# Altium footprint library ICs And Semiconductors SMD.PcbLib: 602 footprints (part 24 of 38)
Each footprint in its own frame and in the unit in brackets; x right, y up, seen from the top. Pads: shape width x height; smd on the part's side, far side on the other; paste and mask are expansions set on the pad; w line width, h text height; cw(c..) or ccw(c..) is an arc to the next point about the centre after c.
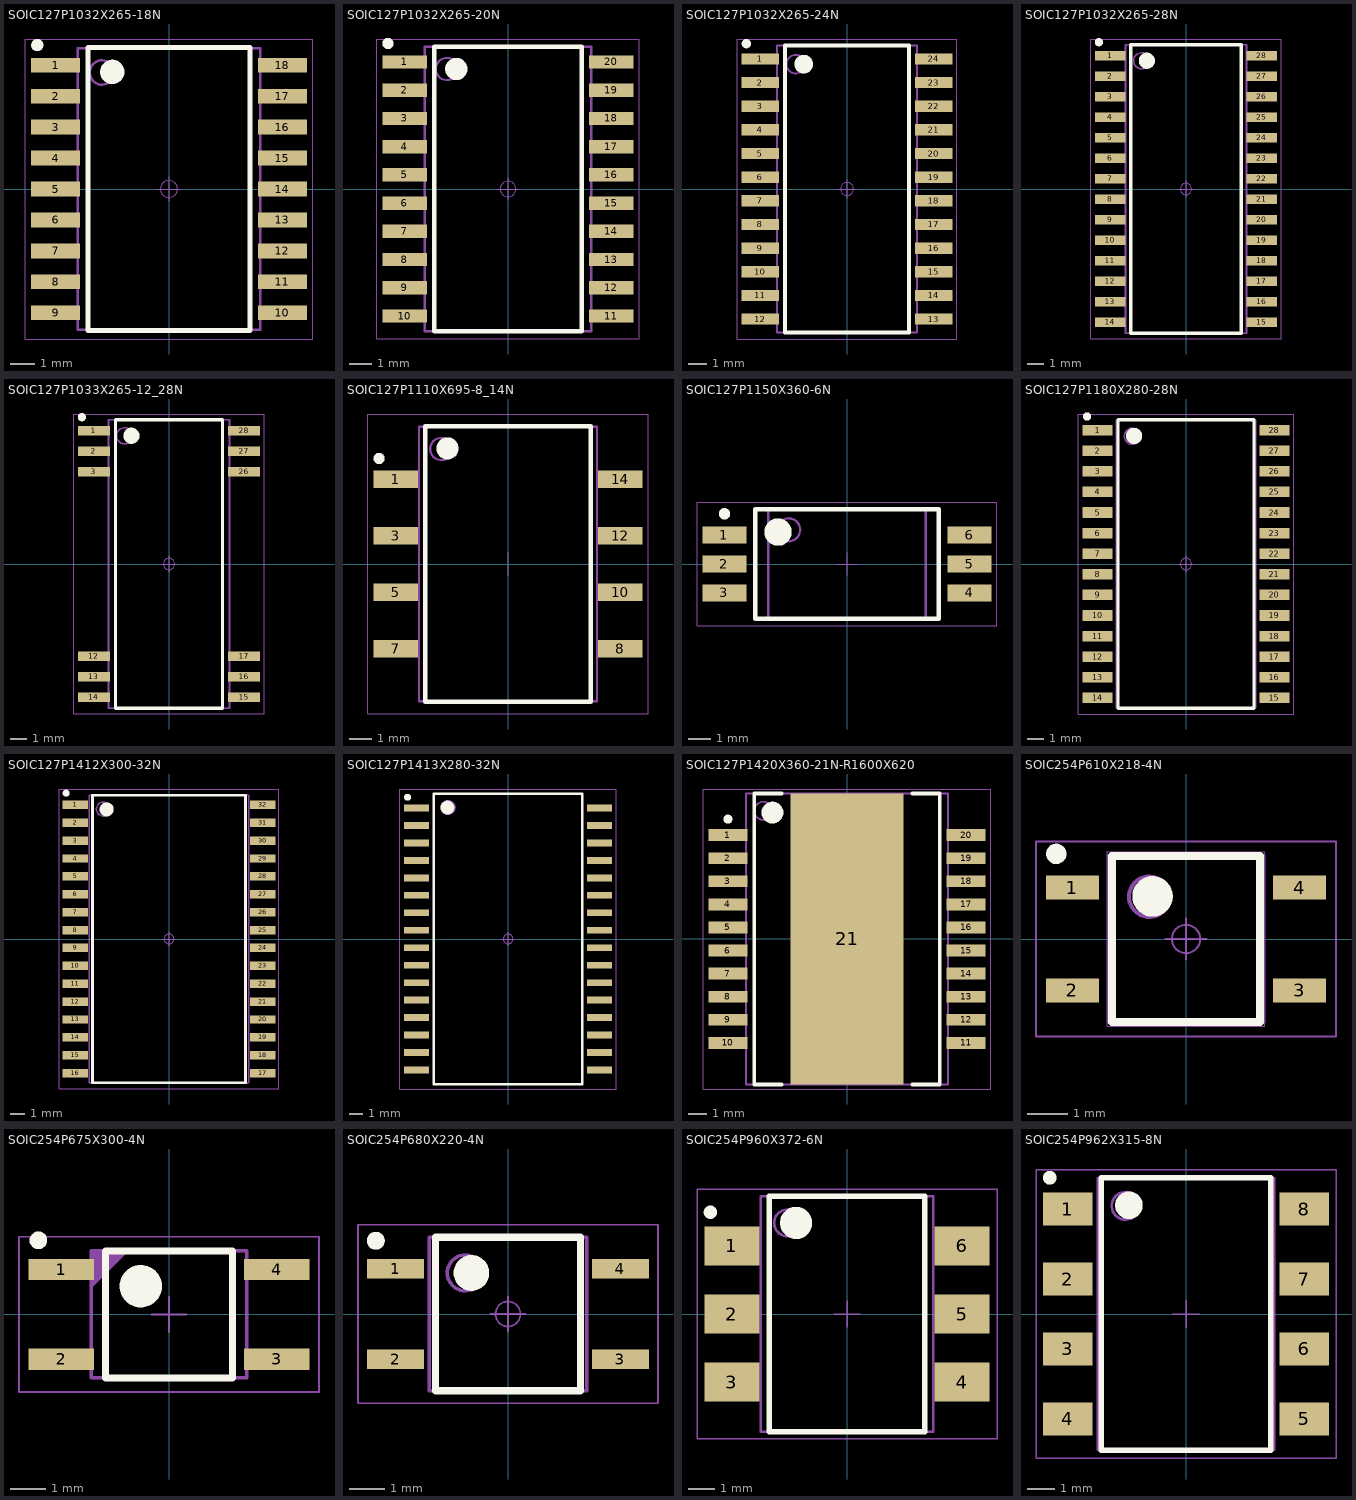
[diagram p23: the footprints below, top view; thin cyan lines are the x and y axes]

## SOIC127P1032X265-18N [mm] "SOIC, 1.27mm Pitch; 18 Pin, 7.50mm W X 11.55mm L X 2.65mm H Body, IPC Medium Density"
height 2.65
pads (18):
  rect 2x0.6 smd: 1(-4.65,5.08) 2(-4.65,3.81) 3(-4.65,2.54) 4(-4.65,1.27) 5(-4.65,0) 6(-4.65,-1.27) 7(-4.65,-2.54) 8(-4.65,-3.81) 9(-4.65,-5.08) 10(4.65,-5.08) 11(4.65,-3.81) 12(4.65,-2.54) 13(4.65,-1.27) 14(4.65,0) 15(4.65,1.27) 16(4.65,2.54) 17(4.65,3.81) 18(4.65,5.08)
Top Overlay:
  circle w0.25: c-5.4,5.9 r0.125
  circle w0.5: c-2.325,4.8 r0.25
  lines w0.2: -3.325,-5.8 -3.325,5.8 3.325,5.8 3.325,-5.8 -3.325,-5.8
Mechanical 14:
  circle w0.1: c-2.75,4.775 r0.5
  lines w0.1: -3.75,-5.775 -3.75,5.775 3.75,5.775 3.75,-5.775 -3.75,-5.775
Mechanical 15:
  circle w0.05: c0,0 r0.35
  lines w0.05: -0.5,0 0.5,0 ; 0,-0.5 0,0.5 ; -5.9,-6.15 -5.9,6.15 5.9,6.15 5.9,-6.15 -5.9,-6.15
3D body "SOIC127P1032X265-18N.stp": height 1.68, standoff 0, extent -5.18,-5.875 5.18,5.875

## SOIC127P1032X265-20N [mm] "SOIC, 1.27mm pitch; 20 pin, 7.50mm W X 12.80mm L X 2.65mm H body, IPC Medium Density"
height 2.65
pads (20):
  rect 2x0.6 smd: 1(-4.65,5.715) 2(-4.65,4.445) 3(-4.65,3.175) 4(-4.65,1.905) 5(-4.65,0.635) 6(-4.65,-0.635) 7(-4.65,-1.905) 8(-4.65,-3.175) 9(-4.65,-4.445) 10(-4.65,-5.715) 11(4.65,-5.715) 12(4.65,-4.445) 13(4.65,-3.175) 14(4.65,-1.905) 15(4.65,-0.635) 16(4.65,0.635) 17(4.65,1.905) 18(4.65,3.175) 19(4.65,4.445) 20(4.65,5.715)
Top Overlay:
  circle w0.5: c-2.325,5.4 r0.25
  circle w0.25: c-5.4,6.55 r0.125
  lines w0.2: -3.325,-6.4 3.325,-6.4 3.325,6.4 -3.325,6.4 -3.325,-6.4
Mechanical 14:
  circle w0.1: c-2.75,5.4 r0.5
  lines w0.1: -3.75,-6.4 3.75,-6.4 3.75,6.4 -3.75,6.4 -3.75,-6.4
Mechanical 15:
  circle w0.05: c0,0 r0.35
  lines w0.05: -0.5,0 0.5,0 ; 0,-0.5 0,0.5 ; -5.9,-6.75 5.9,-6.75 5.9,6.75 -5.9,6.75 -5.9,-6.75
3D body "SOIC127P1032X265-20N.stp": height 1.68, standoff 0, extent -5.18,-6.5 5.18,6.5

## SOIC127P1032X265-24N [mm] "SOIC, 1.27mm Pitch; 24 Pin,7.50mm W X 15.40mm L X 2.65mm H Body, IPC Medium Density"
height 2.65
pads (24):
  rect 2x0.6 smd: 1(-4.65,6.985) 2(-4.65,5.715) 3(-4.65,4.445) 4(-4.65,3.175) 5(-4.65,1.905) 6(-4.65,0.635) 7(-4.65,-0.635) 8(-4.65,-1.905) 9(-4.65,-3.175) 10(-4.65,-4.445) 11(-4.65,-5.715) 12(-4.65,-6.985) 13(4.65,-6.985) 14(4.65,-5.715) 15(4.65,-4.445) 16(4.65,-3.175) 17(4.65,-1.905) 18(4.65,-0.635) 19(4.65,0.635) 20(4.65,1.905) 21(4.65,3.175) 22(4.65,4.445) 23(4.65,5.715) 24(4.65,6.985)
Top Overlay:
  circle w0.25: c-5.4,7.8 r0.125
  circle w0.5: c-2.325,6.7 r0.25
  lines w0.2: -3.325,-7.7 -3.325,7.7 3.325,7.7 3.325,-7.7 -3.325,-7.7
Mechanical 14:
  circle w0.1: c-2.75,6.7 r0.5
  lines w0.1: -3.75,-7.7 -3.75,7.7 3.75,7.7 3.75,-7.7 -3.75,-7.7
Mechanical 15:
  circle w0.05: c0,0 r0.35
  lines w0.05: -0.5,0 0.5,0 ; 0,-0.5 0,0.5 ; -5.9,-8.05 -5.9,8.05 5.9,8.05 5.9,-8.05 -5.9,-8.05
3D body "SOIC127P1032X265-24N.stp": height 1.68, standoff 0, extent -5.18,-7.8 5.18,7.8

## SOIC127P1032X265-28N [mm] "SOIC,1.27mm, Pitch;28 Pin, 7.50mm W X 17.90mm L X 2.65mm H body, IPC Medium Density"
height 2.65
pads (28):
  rect 1.9x0.6 smd: 1(-4.7,8.255) 2(-4.7,6.985) 3(-4.7,5.715) 4(-4.7,4.445) 5(-4.7,3.175) 6(-4.7,1.905) 7(-4.7,0.635) 8(-4.7,-0.635) 9(-4.7,-1.905) 10(-4.7,-3.175) 11(-4.7,-4.445) 12(-4.7,-5.715) 13(-4.7,-6.985) 14(-4.7,-8.255) 15(4.7,-8.255) 16(4.7,-6.985) 17(4.7,-5.715) 18(4.7,-4.445) 19(4.7,-3.175) 20(4.7,-1.905) 21(4.7,-0.635) 22(4.7,0.635) 23(4.7,1.905) 24(4.7,3.175) 25(4.7,4.445) 26(4.7,5.715) 27(4.7,6.985) 28(4.7,8.255)
Top Overlay:
  circle w0.5: c-2.425,7.95 r0.25
  circle w0.25: c-5.4,9.1 r0.125
  lines w0.2: -3.425,-8.95 3.425,-8.95 3.425,8.95 -3.425,8.95 -3.425,-8.95
Mechanical 14:
  circle w0.1: c-2.75,7.95 r0.5
  lines w0.1: -3.75,-8.95 3.75,-8.95 3.75,8.95 -3.75,8.95 -3.75,-8.95
Mechanical 15:
  circle w0.05: c0,0 r0.35
  lines w0.05: -0.5,0 0.5,0 ; 0,-0.5 0,0.5 ; -5.9,-9.3 5.9,-9.3 5.9,9.3 -5.9,9.3 -5.9,-9.3
3D body "SOIC127P1032X265-28N.stp": height 2.65, standoff 0, extent -5.185,-8.95 5.185,8.95

## SOIC127P1033X265-12_28N [mm] "SOIC, Pitch 1.27mm; 12 Pin of 28, 7.50mm W X 17.90mm L X 2.65mm H body, IPC Medium Density"
height 2.65
pads (12):
  rect 2x0.6 smd: 1(-4.65,8.255) 2(-4.65,6.985) 3(-4.65,5.715) 12(-4.65,-5.715) 13(-4.65,-6.985) 14(-4.65,-8.255) 15(4.65,-8.255) 16(4.65,-6.985) 17(4.65,-5.715) 26(4.65,5.715) 27(4.65,6.985) 28(4.65,8.255)
Top Overlay:
  circle w0.5: c-2.325,7.95 r0.25
  circle w0.25: c-5.4,9.1 r0.125
  lines w0.2: -3.325,-8.95 3.325,-8.95 3.325,8.95 -3.325,8.95 -3.325,-8.95
Mechanical 14:
  circle w0.1: c-2.75,7.95 r0.5
  lines w0.1: -3.75,-8.95 3.75,-8.95 3.75,8.95 -3.75,8.95 -3.75,-8.95
Mechanical 15:
  circle w0.05: c0,0 r0.35
  lines w0.05: -0.5,0 0.5,0 ; 0,-0.5 0,0.5 ; -5.9,-9.3 5.9,-9.3 5.9,9.3 -5.9,9.3 -5.9,-9.3
3D body "SOIC127P1033X265-12_28N.stp": height 1.68, standoff 0, extent -5.18,-9.05 5.18,9.05

## SOIC127P1110X695-8_14N [mm] "SOIC, 1.27mm, pitch; 8 of 14 pin, 8.00mm W X 12.35mm L X 6.95mm H body, IPC Medium Density"
height 6.6
pads (8):
  rect 2x0.8 smd: 1(-5.05,3.81) 3(-5.05,1.27) 5(-5.05,-1.27) 7(-5.05,-3.81) 8(5.05,-3.81) 10(5.05,-1.27) 12(5.05,1.27) 14(5.05,3.81)
Top Overlay:
  circle w0.5: c-2.725,5.2 r0.25
  circle w0.25: c-5.8,4.75 r0.125
  lines w0.2: -3.725,-6.2 3.725,-6.2 3.725,6.2 -3.725,6.2 -3.725,-6.2
Mechanical 14:
  circle w0.1: c-3,5.175 r0.5
  lines w0.1: -4,-6.175 4,-6.175 4,6.175 -4,6.175 -4,-6.175
Mechanical 15:
  lines w0.05: 0,-0.5 0,0.5 ; -6.3,-6.75 6.3,-6.75 6.3,6.75 -6.3,6.75 -6.3,-6.75
3D body "SOIC127P1110X695-8_14N.stp": height 6.95, standoff 0, extent -5.626,-6.35 5.626,6.35

## SOIC127P1150X360-6N [mm] "SOIC, 1.27mm Pitch; 6 Pin, 6.90mm W X 4.70mm L X 3.60mm H Body, IPC Medium Density"
height 3.6
pads (6):
  rect 1.91x0.76 smd: 1(-5.37,1.27) 2(-5.37,0) 3(-5.37,-1.27) 4(5.37,-1.27) 5(5.37,0) 6(5.37,1.27)
Top Overlay:
  circle w0.25: c-5.37,2.2 r0.125
  circle w0.6: c-3.025,1.4 r0.3
  lines w0.2: -4.025,-2.4 -4.025,2.4 4.025,2.4 4.025,-2.4 -4.025,-2.4
Mechanical 14:
  circle w0.1: c-2.55,1.5 r0.5
  lines w0.1: -3.45,-2.4 -3.45,2.4 3.45,2.4 3.45,-2.4 -3.45,-2.4
Mechanical 15:
  lines w0.05: -0.5,0 0.5,0 ; 0,-0.5 0,0.5 ; -6.575,-2.7 -6.575,2.7 6.575,2.7 6.575,-2.7 -6.575,-2.7
3D body "SOIC127P1150X360-6N.stp": height 3.6, standoff 0, extent -5.875,-2.417 5.875,2.417

## SOIC127P1180X280-28N [mm] "SOIC, 1.27mm, pitch; 28 pin, 8.60mm W X 17.75mm L X 2.80mm H body, IPC Medium Density"
height 2.8
pads (28):
  rect 1.85x0.65 smd: 1(-5.45,8.255) 2(-5.45,6.985) 3(-5.45,5.715) 4(-5.45,4.445) 5(-5.45,3.175) 6(-5.45,1.905) 7(-5.45,0.635) 8(-5.45,-0.635) 9(-5.45,-1.905) 10(-5.45,-3.175) 11(-5.45,-4.445) 12(-5.45,-5.715) 13(-5.45,-6.985) 14(-5.45,-8.255) 15(5.45,-8.255) 16(5.45,-6.985) 17(5.45,-5.715) 18(5.45,-4.445) 19(5.45,-3.175) 20(5.45,-1.905) 21(5.45,-0.635) 22(5.45,0.635) 23(5.45,1.905) 24(5.45,3.175) 25(5.45,4.445) 26(5.45,5.715) 27(5.45,6.985) 28(5.45,8.255)
Top Overlay:
  circle w0.25: c-6.1,9.1 r0.125
  circle w0.5: c-3.2,7.9 r0.25
  lines w0.2: -4.2,-8.9 -4.2,8.9 4.2,8.9 4.2,-8.9 -4.2,-8.9
Mechanical 14:
  circle w0.1: c-3.3,7.875 r0.5
  lines w0.1: -4.3,-8.875 -4.3,8.875 4.3,8.875 4.3,-8.875 -4.3,-8.875
Mechanical 15:
  circle w0.05: c0,0 r0.35
  lines w0.05: -0.5,0 0.5,0 ; 0,-0.5 0,0.5 ; -6.65,-9.25 -6.65,9.25 6.65,9.25 6.65,-9.25 -6.65,-9.25
3D body "SOIC127P1180X280-28N.stp": height 2.8, standoff 0, extent -5.9,-9 5.9,9

## SOIC127P1412X300-32N [mm] "SOIC, 1.27mm, Pitch; 32 Pin, 11.30mm W X 20.445mm L X 3.00mm H body, IPC Medium Density"
height 3
pads (32):
  rect 1.8x0.6 smd: 1(-6.65,9.525) 2(-6.65,8.255) 3(-6.65,6.985) 4(-6.65,5.715) 5(-6.65,4.445) 6(-6.65,3.175) 7(-6.65,1.905) 8(-6.65,0.635) 9(-6.65,-0.635) 10(-6.65,-1.905) 11(-6.65,-3.175) 12(-6.65,-4.445) 13(-6.65,-5.715) 14(-6.65,-6.985) 15(-6.65,-8.255) 16(-6.65,-9.525) 17(6.65,-9.525) 18(6.65,-8.255) 19(6.65,-6.985) 20(6.65,-5.715) 21(6.65,-4.445) 22(6.65,-3.175) 23(6.65,-1.905) 24(6.65,-0.635) 25(6.65,0.635) 26(6.65,1.905) 27(6.65,3.175) 28(6.65,4.445) 29(6.65,5.715) 30(6.65,6.985) 31(6.65,8.255) 32(6.65,9.525)
Top Overlay:
  circle w0.25: c-7.3,10.35 r0.125
  circle w0.5: c-4.425,9.2 r0.25
  lines w0.2: -5.425,-10.2 -5.425,10.2 5.425,10.2 5.425,-10.2 -5.425,-10.2
Mechanical 14:
  circle w0.1: c-4.65,9.222 r0.5
  lines w0.1: -5.65,-10.222 -5.65,10.222 5.65,10.222 5.65,-10.222 -5.65,-10.222
Mechanical 15:
  circle w0.05: c0,0 r0.35
  lines w0.05: -0.5,0 0.5,0 ; 0,-0.5 0,0.5 ; -7.8,-10.65 -7.8,10.65 7.8,10.65 7.8,-10.65 -7.8,-10.65
3D body "SOIC127P1412X300-32N.stp": height 3, standoff 0, extent -7.081,-10.375 7.081,10.375

## SOIC127P1413X280-32N [mm] "SOIC, 1.27mm Pitch; 32 Pin, 10.70mm W X 21.10mm L X 2.80mm H Body, IPC Medium Density"
height 2.8
pads (32):
  rect 1.85x0.5 smd: 1(-6.65,9.525) 2(-6.65,8.255) 3(-6.65,6.985) 4(-6.65,5.715) 5(-6.65,4.445) 6(-6.65,3.175) 7(-6.65,1.905) 8(-6.65,0.635) 9(-6.65,-0.635) 10(-6.65,-1.905) 11(-6.65,-3.175) 12(-6.65,-4.445) 13(-6.65,-5.715) 14(-6.65,-6.985) 15(-6.65,-8.255) 16(-6.65,-9.525) 17(6.65,-9.525) 18(6.65,-8.255) 19(6.65,-6.985) 20(6.65,-5.715) 21(6.65,-4.445) 22(6.65,-3.175) 23(6.65,-1.905) 24(6.65,-0.635) 25(6.65,0.635) 26(6.65,1.905) 27(6.65,3.175) 28(6.65,4.445) 29(6.65,5.715) 30(6.65,6.985) 31(6.65,8.255) 32(6.65,9.525)
Top Overlay:
  circle w0.5: c-4.4,9.55 r0.25
  circle w0.25: c-7.3,10.3 r0.125
  lines w0.2: -5.4,-10.55 5.4,-10.55 5.4,10.55 -5.4,10.55 -5.4,-10.55
Mechanical 14:
  circle w0.1: c-4.35,9.55 r0.5
  lines w0.1: -5.35,-10.55 5.35,-10.55 5.35,10.55 -5.35,10.55 -5.35,-10.55
Mechanical 15:
  circle w0.05: c0,0 r0.35
  lines w0.05: -0.5,0 0.5,0 ; 0,-0.5 0,0.5 ; -7.85,-10.9 7.85,-10.9 7.85,10.9 -7.85,10.9 -7.85,-10.9
3D body "SOIC127P1413X280-32N.stp": height 3, standoff 0, extent -7.086,-10.5 7.086,10.5

## SOIC127P1420X360-21N-R1600X620 [mm] "SOIC 20, Pitch 1.27mm - Body 11x15.90mm (w/thermal tab 16x6.2mm), IPC Medium Density"
height 3.6
pads (21):
  rect 2.15x0.65 smd: 1(-6.55,5.715) 2(-6.55,4.445) 3(-6.55,3.175) 4(-6.55,1.905) 5(-6.55,0.635) 6(-6.55,-0.635) 7(-6.55,-1.905) 8(-6.55,-3.175) 9(-6.55,-4.445) 10(-6.55,-5.715) 11(6.55,-5.715) 12(6.55,-4.445) 13(6.55,-3.175) 14(6.55,-1.905) 15(6.55,-0.635) 16(6.55,0.635) 17(6.55,1.905) 18(6.55,3.175) 19(6.55,4.445) 20(6.55,5.715)
  rect 6.2x16 smd: 21(0,0)
Top Overlay:
  circle w0.25: c-6.55,6.59 r0.125
  circle w0.6: c-4.1,6.95 r0.3
  lines w0.2: -3.6,-8 -5.1,-8 -5.1,8 -3.6,8 ; 3.6,-8 5.1,-8 5.1,8 3.6,8
Mechanical 14:
  circle w0.1: c-4.6,7.05 r0.5
  lines w0.1: -5.55,-8 -5.55,8 5.55,8 5.55,-8 -5.55,-8
Mechanical 15:
  lines w0.05: -0.5,0 0.5,0 ; 0,-0.5 0,0.5 ; -7.9,-8.25 -7.9,8.25 7.9,8.25 7.9,-8.25 -7.9,-8.25
3D body "SOIC127P1420X360-21AN.stp": height 3.6, standoff 0, extent -7.1,-7.95 7.1,7.95

## SOIC254P610X218-4N [mm] "SOIC, 2.54mm Pitch; 4 Pin, 3.81mm W X 4.089mm L X 2.184mm H body, IPC Medium Density"
height 3
pads (4):
  rect 1.3x0.6 smd: 1(-2.8,1.27) 2(-2.8,-1.27) 3(2.8,-1.27) 4(2.8,1.27)
Top Overlay:
  circle w0.25: c-3.2,2.1 r0.125
  circle w0.5: c-0.825,1.05 r0.25
  lines w0.2: -1.825,-2.05 -1.825,2.05 1.825,2.05 1.825,-2.05 -1.825,-2.05
Mechanical 14:
  circle w0.1: c-0.905,1.044 r0.5
  lines w0.1: -1.905,-2.045 -1.905,2.045 1.905,2.045 1.905,-2.045 -1.905,-2.045
Mechanical 15:
  circle w0.05: c0,0 r0.35
  lines w0.05: -0.5,0 0.5,0 ; 0,-0.5 0,0.5 ; -3.7,-2.4 -3.7,2.4 3.7,2.4 3.7,-2.4 -3.7,-2.4
Mechanical 21:
  lines w0.001: -1.943,-2.146 -1.943,2.146 1.943,2.146 1.943,-2.146 -1.943,-2.146
3D body "SOIC254P610X218-4N.stp": height 2.18, standoff 0, extent -3.05,-2.146 3.05,2.146

## SOIC254P675X300-4N [mm] "SOIC, 4-Leads, Body 3.6x4.4mm, Pitch 2.54mm, IPC Medium Density"
height 3
pads (4):
  rect 1.85x0.6 smd: 1(-3.05,1.27) 2(-3.05,-1.27) 3(3.05,-1.27) 4(3.05,1.27)
Top Overlay:
  circle w0.25: c-3.7,2.1 r0.125
  circle w0.6: c-0.8,0.8 r0.3
  lines w0.2: -1.8,-1.8 1.8,-1.8 1.8,1.8 -1.8,1.8 -1.8,-1.8
Mechanical 14:
  lines w0.1: -2.2,0.8 -1.2,1.8 ; -2.2,0.9 -1.3,1.8 ; -2.2,1 -1.4,1.8 ; -2.2,1.1 -1.5,1.8 ; -2.2,1.2 -1.6,1.8 ; -2.2,1.3 -1.7,1.8 ; -2.2,1.4 -1.8,1.8 ; -2.2,1.5 -1.9,1.8 ; -2.2,1.6 -2,1.8 ; -2.2,1.7 -2.1,1.8 ; -2.2,-1.8 -2.2,1.8 2.2,1.8 2.2,-1.8 -2.2,-1.8
Mechanical 15:
  lines w0.05: -0.5,0 0.5,0 ; 0,-0.5 0,0.5 ; -4.25,-2.2 -4.25,2.2 4.25,2.2 4.25,-2.2 -4.25,-2.2
3D body "SOIC254P675X300-4N.stp": height 3, standoff 0, extent -3.6,-1.95 3.6,1.95

## SOIC254P680X220-4N [mm] "SOIC,2.54mm,pitch;4 pin,4.40mm W X 4.30mm L X 2.20mm H body, IPC Medium Density"
height 2.2
pads (4):
  rect 1.6x0.55 smd: 1(-3.15,1.27) 2(-3.15,-1.27) 3(3.15,-1.27) 4(3.15,1.27)
Top Overlay:
  circle w0.5: c-1.025,1.15 r0.25
  circle w0.25: c-3.7,2.05 r0.125
  lines w0.2: -2.025,-2.15 2.025,-2.15 2.025,2.15 -2.025,2.15 -2.025,-2.15
Mechanical 14:
  circle w0.1: c-1.2,1.15 r0.5
  lines w0.1: -2.2,-2.15 2.2,-2.15 2.2,2.15 -2.2,2.15 -2.2,-2.15
Mechanical 15:
  circle w0.05: c0,0 r0.35
  lines w0.05: -0.5,0 0.5,0 ; 0,-0.5 0,0.5 ; -4.2,-2.5 4.2,-2.5 4.2,2.5 -4.2,2.5 -4.2,-2.5
3D body "SOIC254P680X220-4N.stp": height 2.2, standoff 0, extent -3.6,-2.15 3.6,2.15

## SOIC254P960X372-6N [mm] "SOIC,2.54mm pitch;6 pin,6.44mm W X 8.80mm L, IPC Medium Density"
height 3.72
pads (6):
  rect 2.05x1.45 smd: 1(-4.3,2.54) 2(-4.3,0) 3(-4.3,-2.54) 4(4.3,-2.54) 5(4.3,0) 6(4.3,2.54)
Top Overlay:
  circle w0.6: c-1.9,3.4 r0.3
  circle w0.25: c-5.1,3.8 r0.125
  lines w0.2: -2.9,-4.4 -2.9,4.4 2.9,4.4 2.9,-4.4 -2.9,-4.4
Mechanical 14:
  circle w0.1: c-2.22,3.4 r0.5
  lines w0.1: -3.22,-4.4 -3.22,4.4 3.22,4.4 3.22,-4.4 -3.22,-4.4
Mechanical 15:
  lines w0.05: -0.5,0 0.5,0 ; 0,-0.5 0,0.5 ; -5.6,-4.65 -5.6,4.65 5.6,4.65 5.6,-4.65 -5.6,-4.65
3D body "SOIC254P960X372-6N.stp": height 3.6, standoff 0, extent -4.842,-4.425 4.842,4.425

## SOIC254P962X315-8N [mm] "DIP Gull Wing Surface Mount, 8-Leads, Body 9.86x6.4mm (nom), Pitch 2.54mm, IPC Medium Density"
height 3.15
pads (8):
  rect 1.8x1.2 smd: 1(-4.3,3.81) 2(-4.3,1.27) 3(-4.3,-1.27) 4(-4.3,-3.81) 5(4.3,-3.81) 6(4.3,-1.27) 7(4.3,1.27) 8(4.3,3.81)
Top Overlay:
  circle w0.25: c-4.95,4.95 r0.125
  circle w0.5: c-2.075,3.95 r0.25
  lines w0.2: -3.075,-4.95 -3.075,4.95 3.075,4.95 3.075,-4.95 -3.075,-4.95
Mechanical 14:
  circle w0.1: c-2.2,3.93 r0.5
  lines w0.1: -3.2,-4.93 3.2,-4.93 3.2,4.93 -3.2,4.93 -3.2,-4.93
Mechanical 15:
  lines w0.05: -0.5,0 0.5,0 ; 0,-0.5 0,0.5 ; -5.45,-5.25 5.45,-5.25 5.45,5.25 -5.45,5.25 -5.45,-5.25
3D body "SOIC254P962X315-8N.stp": height 2.95, standoff 0, extent -4.81,-4.94 4.81,4.97